# Altium footprint library heromap.PcbLib: 593 footprints (part 30 of 38)
Each footprint in its own frame and in the unit in brackets; x right, y up, seen from the top. Pads: shape width x height; smd on the part's side, far side on the other; paste and mask are expansions set on the pad; w line width, h text height; cw(c..) or ccw(c..) is an arc to the next point about the centre after c.
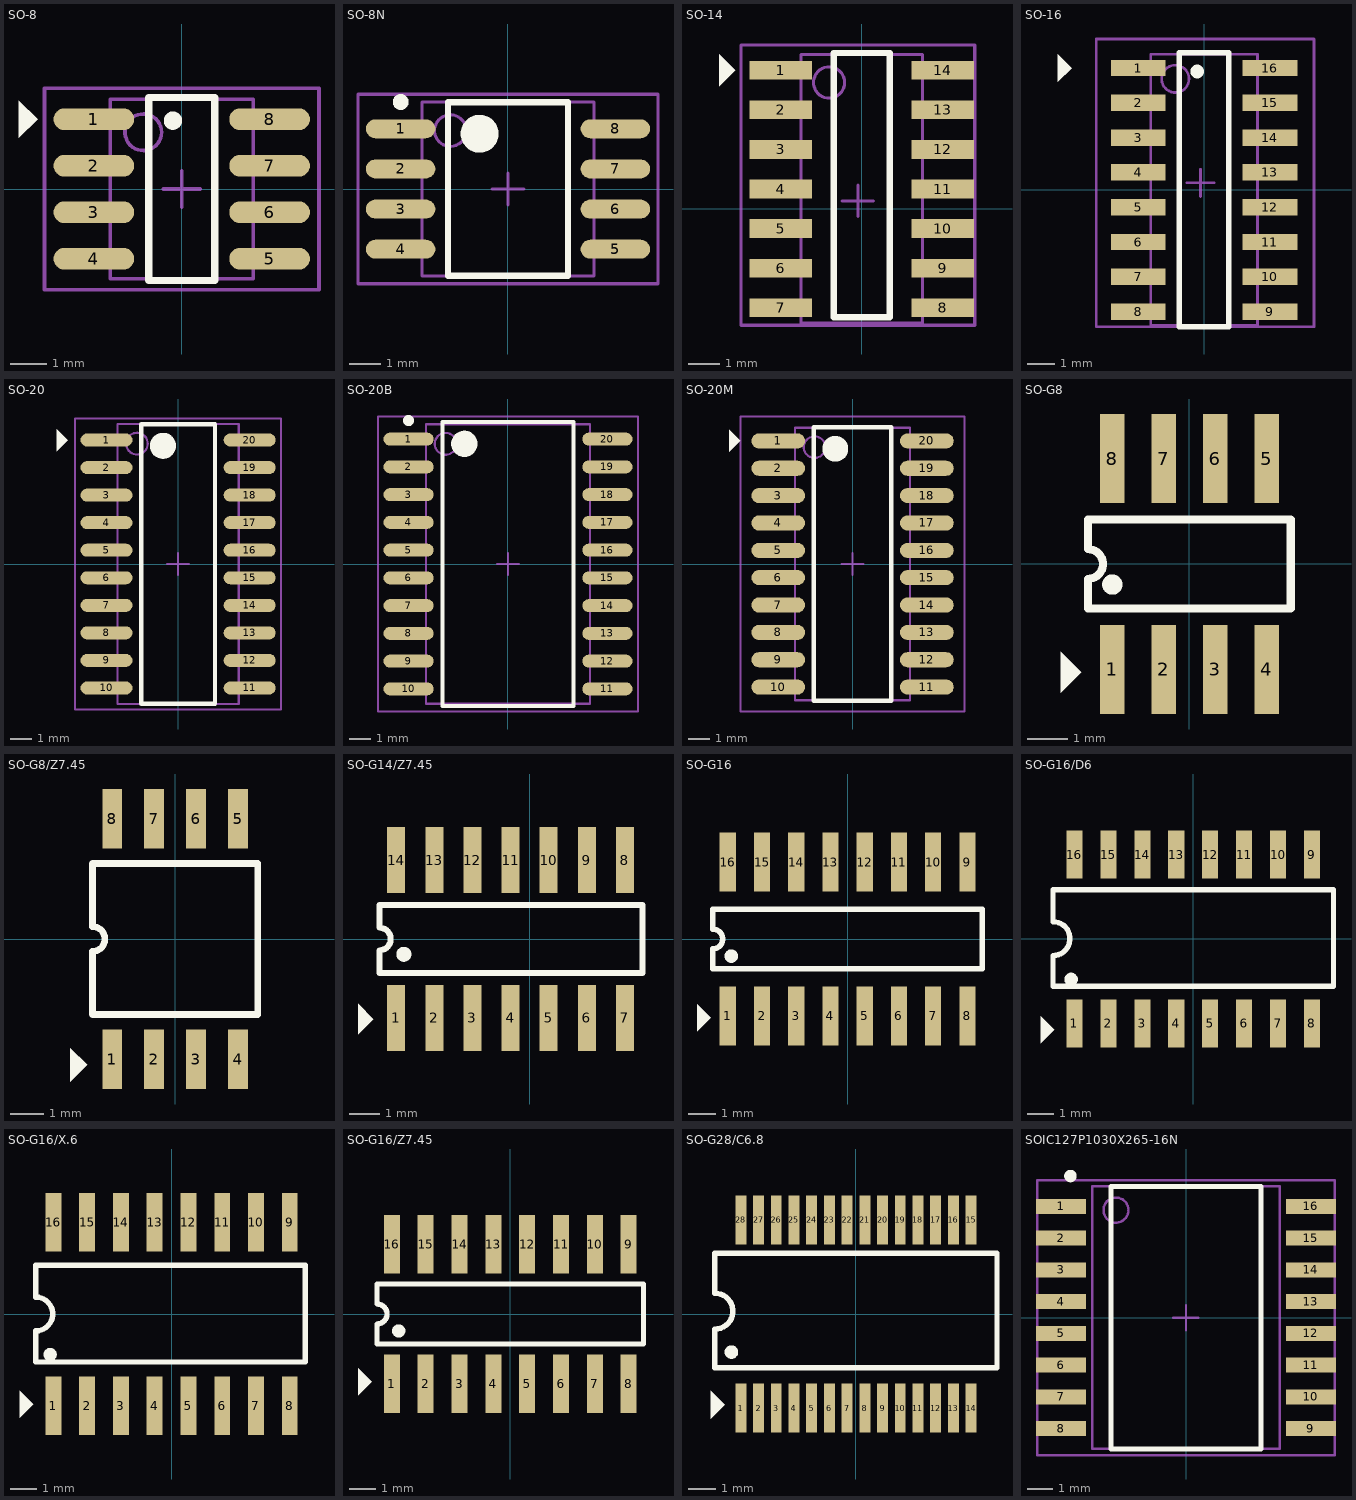
[diagram p29: the footprints below, top view; thin cyan lines are the x and y axes]

## SO-8 [mm] "8-Pin Small Outline Integrated Circuit 1.27 mm Pitch, IPC Medium Density"
height 1.75
pads (8):
  oval 2.2x0.6 smd: 1(-2.4,1.905) 2(-2.4,0.635) 3(-2.4,-0.635) 4(-2.4,-1.905) 5(2.4,-1.905) 6(2.4,-0.635) 7(2.4,0.635) 8(2.4,1.905)
Top Overlay:
  circle w0.25: c-0.241,1.866 r0.125
  region: -4.445,1.397 -3.937,1.905 -4.445,2.413
  lines w0.2: -0.9,-2.5 -0.9,2.5 0.9,2.5 0.9,-2.5 -0.9,-2.5
Mechanical 13:
  circle w0.1: c-1.05,1.55 r0.5
  lines w0.1: -1.95,-2.45 -1.95,2.45 1.95,2.45 1.95,-2.45 -1.95,-2.45
Mechanical 15:
  lines w0.1: -0.5,0 0.5,0 ; 0,-0.5 0,0.5 ; -3.75,-2.75 -3.75,2.75 3.75,2.75 3.75,-2.75 -3.75,-2.75
3D body: height 1.75, standoff 0, extent -1.95,-2.45 1.95,2.45

## SO-8N [mm] "SOP, 8-Leads, Body 5.3x5.3mm, Pitch 1.27mm, IPC Medium Density"
height 2.03
pads (8):
  oval 2.2x0.6 smd: 1(-3.4,1.905) 2(-3.4,0.635) 3(-3.4,-0.635) 4(-3.4,-1.905) 5(3.4,-1.905) 6(3.4,-0.635) 7(3.4,0.635) 8(3.4,1.905)
Top Overlay:
  circle w0.25: c-3.4,2.755 r0.125
  circle w0.6: c-0.9,1.75 r0.3
  lines w0.2: -1.9,-2.75 -1.9,2.75 1.9,2.75 1.9,-2.75 -1.9,-2.75
Mechanical 13:
  circle w0.1: c-1.825,1.85 r0.5
  lines w0.1: -2.725,-2.75 -2.725,2.75 2.725,2.75 2.725,-2.75 -2.725,-2.75
Mechanical 15:
  lines w0.1: -0.5,0 0.5,0 ; 0,-0.5 0,0.5 ; -4.75,-3 -4.75,3 4.75,3 4.75,-3 -4.75,-3
3D body: height 2.03, standoff 0, extent -2.725,-2.75 2.725,2.75

## SO-14 [mm] "SOIC, 14-Leads, Body 9.9x3.9mm, Pitch 1.27mm, IPC Medium Density"
height 1.75
pads (14):
  rect 2x0.6 smd: 1(-2.6,4.445) 2(-2.6,3.175) 3(-2.6,1.905) 4(-2.6,0.635) 5(-2.6,-0.635) 6(-2.6,-1.905) 7(-2.6,-3.175) 8(2.6,-3.175) 9(2.6,-1.905) 10(2.6,-0.635) 11(2.6,0.635) 12(2.6,1.905) 13(2.6,3.175) 14(2.6,4.445)
Top Overlay:
  region: -4.572,3.937 -4.064,4.445 -4.572,4.953
  lines w0.2: -0.9,-3.48 -0.9,5 0.9,5 0.9,-3.48 -0.9,-3.48
Mechanical 13:
  circle w0.1: c-1.05,4.05 r0.5
  lines w0.1: -1.95,-3.658 -1.95,4.95 1.95,4.95 1.95,-3.658 -1.95,-3.658
Mechanical 15:
  lines w0.1: -0.627,0.254 0.373,0.254 ; -0.127,-0.246 -0.127,0.754 ; -3.877,-3.734 -3.877,5.258 3.623,5.258 3.623,-3.734 -3.877,-3.734
3D body: height 1.75, standoff 0, extent -1.956,-3.658 1.95,4.95
3D body: height 0.1, standoff 0, extent 2.6,4.191 3.362,4.699
3D body: height 1.35, standoff 0, extent 2.473,4.191 2.6,4.699
3D body: height 1.35, standoff 1.25, extent 1.203,4.191 2.473,4.699
3D body: height 0.1, standoff 0, extent 2.6,2.921 3.362,3.429
3D body: height 1.35, standoff 0, extent 2.473,2.921 2.6,3.429
3D body: height 1.35, standoff 1.25, extent 1.203,2.921 2.473,3.429
3D body: height 0.1, standoff 0, extent 2.6,1.651 3.362,2.159
3D body: height 1.35, standoff 0, extent 2.473,1.651 2.6,2.159
3D body: height 1.35, standoff 1.25, extent 1.203,1.651 2.473,2.159
3D body: height 0.1, standoff 0, extent 2.6,0.381 3.362,0.889
3D body: height 1.35, standoff 0, extent 2.473,0.381 2.6,0.889
3D body: height 1.35, standoff 1.25, extent 1.203,0.381 2.473,0.889
3D body: height 0.1, standoff 0, extent 2.6,-0.889 3.362,-0.381
3D body: height 1.35, standoff 0, extent 2.473,-0.889 2.6,-0.381
3D body: height 1.35, standoff 1.25, extent 1.203,-0.889 2.473,-0.381
3D body: height 0.1, standoff 0, extent 2.6,-2.159 3.362,-1.651
3D body: height 1.35, standoff 0, extent 2.473,-2.159 2.6,-1.651
3D body: height 1.35, standoff 1.25, extent 1.203,-2.159 2.473,-1.651
3D body: height 0.1, standoff 0, extent 2.6,-3.429 3.362,-2.921
3D body: height 1.35, standoff 0, extent 2.473,-3.429 2.6,-2.921
3D body: height 1.35, standoff 1.25, extent 1.203,-3.429 2.473,-2.921
3D body: height 0.1, standoff 0, extent -3.362,-3.429 -2.6,-2.921
3D body: height 1.35, standoff 0, extent -2.6,-3.429 -2.473,-2.921
3D body: height 1.35, standoff 1.25, extent -2.473,-3.429 -1.203,-2.921
3D body: height 0.1, standoff 0, extent -3.362,-2.159 -2.6,-1.651
3D body: height 1.35, standoff 0, extent -2.6,-2.159 -2.473,-1.651
3D body: height 1.35, standoff 1.25, extent -2.473,-2.159 -1.203,-1.651
3D body: height 0.1, standoff 0, extent -3.362,-0.889 -2.6,-0.381
3D body: height 1.35, standoff 0, extent -2.6,-0.889 -2.473,-0.381
3D body: height 1.35, standoff 1.25, extent -2.473,-0.889 -1.203,-0.381
3D body: height 0.1, standoff 0, extent -3.362,0.381 -2.6,0.889
3D body: height 1.35, standoff 0, extent -2.6,0.381 -2.473,0.889
3D body: height 1.35, standoff 1.25, extent -2.473,0.381 -1.203,0.889
3D body: height 0.1, standoff 0, extent -3.362,1.651 -2.6,2.159
3D body: height 1.35, standoff 0, extent -2.6,1.651 -2.473,2.159
3D body: height 1.35, standoff 1.25, extent -2.473,1.651 -1.203,2.159
3D body: height 0.1, standoff 0, extent -3.362,2.921 -2.6,3.429
3D body: height 1.35, standoff 0, extent -2.6,2.921 -2.473,3.429
3D body: height 1.35, standoff 1.25, extent -2.473,2.921 -1.203,3.429
3D body: height 1.35, standoff 1.25, extent -2.489,4.191 -1.219,4.699
3D body: height 1.35, standoff 0, extent -2.616,4.191 -2.489,4.699
3D body: height 0.1, standoff 0, extent -3.378,4.191 -2.616,4.699

## SO-16 [mm] "SOIC, 16-Leads, Body 9.9x3.9mm, Pitch 1.27mm, IPC Medium Density"
height 1.75
pads (16):
  rect 2x0.6 smd: 1(-2.4,4.445) 2(-2.4,3.175) 3(-2.4,1.905) 4(-2.4,0.635) 5(-2.4,-0.635) 6(-2.4,-1.905) 7(-2.4,-3.175) 8(-2.4,-4.445) 9(2.4,-4.445) 10(2.4,-3.175) 11(2.4,-1.905) 12(2.4,-0.635) 13(2.4,0.635) 14(2.4,1.905) 15(2.4,3.175) 16(2.4,4.445)
Top Overlay:
  circle w0.25: c-0.252,4.318 r0.125
  region: -5.334,3.937 -4.826,4.445 -5.334,4.953
  lines w0.2: -0.9,-5 -0.9,5 0.9,5 0.9,-5 -0.9,-5
Mechanical 13:
  circle w0.1: c-1.05,4.05 r0.5
  lines w0.1: -1.95,-4.95 -1.95,4.95 1.95,4.95 1.95,-4.95 -1.95,-4.95
Mechanical 15:
  lines w0.1: -0.627,0.254 0.373,0.254 ; -0.127,-0.246 -0.127,0.754 ; -3.937,-4.996 -3.937,5.504 4.013,5.504 4.013,-4.996 -3.937,-4.996
3D body: height 1.75, standoff 0, extent -1.95,-4.95 1.95,4.95
3D body: height 0.9, standoff 0.7, extent 1.354,-4.691 2.393,-4.199
3D body: height 0.9, standoff 0, extent 2.393,-4.691 2.718,-4.199
3D body: height 0.2, standoff 0, extent 2.718,-4.691 3.414,-4.199
3D body: height 0.9, standoff 0.7, extent 1.379,-3.421 2.418,-2.929
3D body: height 0.9, standoff 0, extent 2.418,-3.421 2.743,-2.929
3D body: height 0.2, standoff 0, extent 2.743,-3.421 3.439,-2.929
3D body: height 0.9, standoff 0.7, extent 1.379,-2.151 2.418,-1.659
3D body: height 0.9, standoff 0, extent 2.418,-2.151 2.743,-1.659
3D body: height 0.2, standoff 0, extent 2.743,-2.151 3.439,-1.659
3D body: height 0.9, standoff 0.7, extent 1.481,-0.881 2.52,-0.389
3D body: height 0.9, standoff 0, extent 2.52,-0.881 2.845,-0.389
3D body: height 0.2, standoff 0, extent 2.845,-0.881 3.541,-0.389
3D body: height 0.9, standoff 0.7, extent 1.379,0.389 2.418,0.881
3D body: height 0.9, standoff 0, extent 2.418,0.389 2.743,0.881
3D body: height 0.2, standoff 0, extent 2.743,0.389 3.439,0.881
3D body: height 0.9, standoff 0.7, extent 1.405,1.659 2.443,2.151
3D body: height 0.9, standoff 0, extent 2.443,1.659 2.769,2.151
3D body: height 0.2, standoff 0, extent 2.769,1.659 3.465,2.151
3D body: height 0.9, standoff 0.7, extent 1.328,2.903 2.367,3.396
3D body: height 0.9, standoff 0, extent 2.367,2.903 2.692,3.396
3D body: height 0.2, standoff 0, extent 2.692,2.903 3.388,3.396
3D body: height 0.9, standoff 0.7, extent 1.354,4.199 2.393,4.691
3D body: height 0.9, standoff 0, extent 2.393,4.199 2.718,4.691
3D body: height 0.2, standoff 0, extent 2.718,4.199 3.414,4.691
3D body: height 0.2, standoff 0, extent -3.389,-4.686 -2.693,-4.194
3D body: height 0.9, standoff 0, extent -2.693,-4.686 -2.368,-4.194
3D body: height 0.9, standoff 0.7, extent -2.368,-4.686 -1.329,-4.194
3D body: height 0.2, standoff 0, extent -3.364,-3.391 -2.668,-2.898
3D body: height 0.9, standoff 0, extent -2.668,-3.391 -2.343,-2.898
3D body: height 0.9, standoff 0.7, extent -2.343,-3.391 -1.304,-2.898
3D body: height 0.2, standoff 0, extent -3.44,-2.146 -2.744,-1.654
3D body: height 0.9, standoff 0, extent -2.744,-2.146 -2.419,-1.654
3D body: height 0.9, standoff 0.7, extent -2.419,-2.146 -1.38,-1.654
3D body: height 0.2, standoff 0, extent -3.415,-0.876 -2.719,-0.384
3D body: height 0.9, standoff 0, extent -2.719,-0.876 -2.394,-0.384
3D body: height 0.9, standoff 0.7, extent -2.394,-0.876 -1.355,-0.384
3D body: height 0.2, standoff 0, extent -3.516,0.394 -2.82,0.886
3D body: height 0.9, standoff 0, extent -2.82,0.394 -2.495,0.886
3D body: height 0.9, standoff 0.7, extent -2.495,0.394 -1.456,0.886
3D body: height 0.2, standoff 0, extent -3.415,1.664 -2.719,2.156
3D body: height 0.9, standoff 0, extent -2.719,1.664 -2.394,2.156
3D body: height 0.9, standoff 0.7, extent -2.394,1.664 -1.355,2.156
3D body: height 0.2, standoff 0, extent -3.415,2.934 -2.719,3.426
3D body: height 0.9, standoff 0, extent -2.719,2.934 -2.394,3.426
3D body: height 0.9, standoff 0.7, extent -2.394,2.934 -1.355,3.426
3D body: height 0.2, standoff 0, extent -3.389,4.204 -2.693,4.696
3D body: height 0.9, standoff 0, extent -2.693,4.204 -2.368,4.696
3D body: height 0.9, standoff 0.7, extent -2.368,4.204 -1.329,4.696

## SO-20 [mm] "20-Pin Small Outline Package 1.27 mm Pitch"
height 2
pads (20):
  oval 2.4x0.6 smd: 1(-3.3,5.715) 2(-3.3,4.445) 3(-3.3,3.175) 4(-3.3,1.905) 5(-3.3,0.635) 6(-3.3,-0.635) 7(-3.3,-1.905) 8(-3.3,-3.175) 9(-3.3,-4.445) 10(-3.3,-5.715) 11(3.3,-5.715) 12(3.3,-4.445) 13(3.3,-3.175) 14(3.3,-1.905) 15(3.3,-0.635) 16(3.3,0.635) 17(3.3,1.905) 18(3.3,3.175) 19(3.3,4.445) 20(3.3,5.715)
Top Overlay:
  circle w0.6: c-0.7,5.45 r0.3
  region: -5.588,5.207 -5.08,5.715 -5.588,6.223
  lines w0.2: -1.7,-6.45 1.7,-6.45 1.7,6.45 -1.7,6.45 -1.7,-6.45
Mechanical 13:
  circle w0.1: c-1.9,5.55 r0.5
  lines w0.1: -2.8,-6.45 2.8,-6.45 2.8,6.45 -2.8,6.45 -2.8,-6.45
Mechanical 15:
  lines w0.1: -0.5,0 0.5,0 ; 0,-0.5 0,0.5 ; -4.75,-6.7 4.75,-6.7 4.75,6.7 -4.75,6.7 -4.75,-6.7
3D body: height 2, standoff 0, extent -2.8,-6.45 2.8,6.45

## SO-20B [mm] "SOIC, 20-Leads, Body 12.8x7.5mm, Pitch 1.27mm, IPC Medium Density"
height 2.6
pads (20):
  oval 2.3x0.6 smd: 1(-4.55,5.715) 2(-4.55,4.445) 3(-4.55,3.175) 4(-4.55,1.905) 5(-4.55,0.635) 6(-4.55,-0.635) 7(-4.55,-1.905) 8(-4.55,-3.175) 9(-4.55,-4.445) 10(-4.55,-5.715) 11(4.55,-5.715) 12(4.55,-4.445) 13(4.55,-3.175) 14(4.55,-1.905) 15(4.55,-0.635) 16(4.55,0.635) 17(4.55,1.905) 18(4.55,3.175) 19(4.55,4.445) 20(4.55,5.715)
Top Overlay:
  circle w0.25: c-4.55,6.565 r0.125
  circle w0.6: c-2,5.5 r0.3
  lines w0.2: -3,-6.5 -3,6.5 3,6.5 3,-6.5 -3,-6.5
Mechanical 13:
  circle w0.1: c-2.85,5.5 r0.5
  lines w0.1: -3.75,-6.4 -3.75,6.4 3.75,6.4 3.75,-6.4 -3.75,-6.4
Mechanical 15:
  lines w0.1: -0.5,0 0.5,0 ; 0,-0.5 0,0.5 ; -5.95,-6.75 -5.95,6.75 5.95,6.75 5.95,-6.75 -5.95,-6.75
3D body: height 2.6, standoff 0, extent -3.75,-6.4 3.75,6.4

## SO-20M [mm] "SOP, 20-Leads, Body 12.6x5.3mm, Pitch 1.27mm, IPC Low Density"
height 1.96
pads (20):
  oval 2.5x0.7 smd: 1(-3.45,5.715) 2(-3.45,4.445) 3(-3.45,3.175) 4(-3.45,1.905) 5(-3.45,0.635) 6(-3.45,-0.635) 7(-3.45,-1.905) 8(-3.45,-3.175) 9(-3.45,-4.445) 10(-3.45,-5.715) 11(3.45,-5.715) 12(3.45,-4.445) 13(3.45,-3.175) 14(3.45,-1.905) 15(3.45,-0.635) 16(3.45,0.635) 17(3.45,1.905) 18(3.45,3.175) 19(3.45,4.445) 20(3.45,5.715)
Top Overlay:
  circle w0.6: c-0.8,5.35 r0.3
  region: -5.715,5.207 -5.207,5.715 -5.715,6.223
  lines w0.2: -1.8,-6.35 -1.8,6.35 1.8,6.35 1.8,-6.35 -1.8,-6.35
Mechanical 13:
  circle w0.1: c-1.765,5.425 r0.5
  lines w0.1: -2.665,-6.325 -2.665,6.325 2.665,6.325 2.665,-6.325 -2.665,-6.325
Mechanical 15:
  lines w0.1: -0.5,0 0.5,0 ; 0,-0.5 0,0.5 ; -5.2,-6.85 -5.2,6.85 5.2,6.85 5.2,-6.85 -5.2,-6.85
3D body: height 1.96, standoff 0, extent -2.665,-6.325 2.665,6.325

## SO-G8 [mm] "Small Outline; 8 Leads; Body Width 3.9 mm; Pitch 1.27 mm"
height 1.75
pads (8):
  rect 0.6x2.2 smd: 1(-1.905,-2.6) 2(-0.635,-2.6) 3(0.635,-2.6) 4(1.905,-2.6) 5(1.905,2.6) 6(0.635,2.6) 7(-0.635,2.6) 8(-1.905,2.6)
Top Overlay:
  circle w0.25: c-1.903,-0.508 r0.125
  region: -3.175,-3.175 -2.667,-2.667 -3.175,-2.159
  lines w0.2: -2.5,-1.1 -2.5,-0.367 ccw(c-2.5,0) -2.5,0.367 -2.5,1.1 2.5,1.1 2.5,-1.1 -2.5,-1.1

## SO-G8/Z7.45 [mm] "Small Outline; 8 Leads; Body Width 3.9 mm; Pitch 1.27 mm"
height 1.75
pads (8):
  rect 0.6x1.8 smd: 1(-1.905,-3.641) 2(-0.635,-3.641) 3(0.635,-3.641) 4(1.905,-3.641) 5(1.905,3.641) 6(0.635,3.641) 7(-0.635,3.641) 8(-1.905,3.641)
Top Overlay:
  region: -3.175,-4.318 -2.667,-3.81 -3.175,-3.302
  lines w0.2: -2.5,-2.286 -2.5,-0.375 ccw(c-2.5,0) -2.5,0.375 -2.5,2.286 2.5,2.286 2.5,-2.286 -2.5,-2.286
3D body: height 1.5, standoff 0.1, extent -2.794,-2.54 2.794,2.54
3D body: height 0.25, standoff 0, extent 1.651,3.051 2.159,3.737
3D body: height 0.9, standoff 0.65, extent 1.651,2.537 2.159,3.051
3D body: height 0.9, standoff 0, extent 1.651,2.95 2.159,3.102
3D body: height 0.9, standoff 0, extent 0.381,2.95 0.889,3.102
3D body: height 0.9, standoff 0.65, extent 0.381,2.537 0.889,3.051
3D body: height 0.25, standoff 0, extent 0.381,3.051 0.889,3.737
3D body: height 0.25, standoff 0, extent -2.159,3.051 -1.651,3.737
3D body: height 0.9, standoff 0.65, extent -2.159,2.537 -1.651,3.051
3D body: height 0.9, standoff 0, extent -2.159,2.95 -1.651,3.102
3D body: height 0.9, standoff 0, extent -0.889,2.95 -0.381,3.102
3D body: height 0.9, standoff 0.65, extent -0.889,2.537 -0.381,3.051
3D body: height 0.25, standoff 0, extent -0.889,3.051 -0.381,3.737
3D body: height 0.25, standoff 0, extent -2.159,-3.74 -1.651,-3.055
3D body: height 0.9, standoff 0.65, extent -2.159,-3.055 -1.651,-2.54
3D body: height 0.9, standoff 0, extent -2.159,-3.105 -1.651,-2.953
3D body: height 0.9, standoff 0, extent -0.889,-3.105 -0.381,-2.953
3D body: height 0.9, standoff 0.65, extent -0.889,-3.055 -0.381,-2.54
3D body: height 0.25, standoff 0, extent -0.889,-3.74 -0.381,-3.055
3D body: height 0.25, standoff 0, extent 1.651,-3.74 2.159,-3.055
3D body: height 0.9, standoff 0.65, extent 1.651,-3.055 2.159,-2.54
3D body: height 0.9, standoff 0, extent 1.651,-3.105 2.159,-2.953
3D body: height 0.9, standoff 0, extent 0.381,-3.105 0.889,-2.953
3D body: height 0.9, standoff 0.65, extent 0.381,-3.055 0.889,-2.54
3D body: height 0.25, standoff 0, extent 0.381,-3.74 0.889,-3.055

## SO-G14/Z7.45 [mm] "Small Outline; 14 Leads; Body Width 3.9 mm; Pitch 1.27 mm"
height 1.75
pads (14):
  rect 0.6x2.2 smd: 1(-4.445,-2.625) 2(-3.175,-2.625) 3(-1.905,-2.625) 4(-0.635,-2.625) 5(0.635,-2.625) 6(1.905,-2.625) 7(3.175,-2.625) 8(3.175,2.625) 9(1.905,2.625) 10(0.635,2.625) 11(-0.635,2.625) 12(-1.905,2.625) 13(-3.175,2.625) 14(-4.445,2.625)
Top Overlay:
  circle w0.25: c-4.189,-0.508 r0.125
  region: -5.715,-3.175 -5.207,-2.667 -5.715,-2.159
  lines w0.2: -5,-1.125 3.759,-1.125 3.759,1.125 -5,1.125 -5,0.375 cw(c-5,0) -5,-0.375 -5,-1.125

## SO-G16 [mm] "Small Outline; 16 Leads; Body Width 3.9 mm; Pitch 1.27 mm"
height 1.75
pads (16):
  rect 0.6x2.2 smd: 1(-4.445,-2.854) 2(-3.175,-2.854) 3(-1.905,-2.854) 4(-0.635,-2.854) 5(0.635,-2.854) 6(1.905,-2.854) 7(3.175,-2.854) 8(4.445,-2.854) 9(4.445,2.854) 10(3.175,2.854) 11(1.905,2.854) 12(0.635,2.854) 13(-0.635,2.854) 14(-1.905,2.854) 15(-3.175,2.854) 16(-4.445,2.854)
Top Overlay:
  circle w0.25: c-4.316,-0.635 r0.125
  region: -5.588,-3.429 -5.08,-2.921 -5.588,-2.413
  lines w0.2: -5,-1.1 -5,-0.367 ccw(c-5,0) -5,0.367 -5,1.1 5,1.1 5,-1.1 -5,-1.1

## SO-G16/D6 [mm] "Small Outline; 16 Leads; Body Width 5.3 mm; Pitch 1.27 mm"
height 2
pads (16):
  rect 0.6x1.8 smd: 1(-4.445,-3.168) 2(-3.175,-3.168) 3(-1.905,-3.168) 4(-0.635,-3.168) 5(0.635,-3.168) 6(1.905,-3.168) 7(3.175,-3.168) 8(4.445,-3.168) 9(4.445,3.143) 10(3.175,3.143) 11(1.905,3.143) 12(0.635,3.143) 13(-0.635,3.143) 14(-1.905,3.143) 15(-3.175,3.143) 16(-4.445,3.143)
Top Overlay:
  circle w0.25: c-4.57,-1.524 r0.125
  region: -5.715,-3.912 -5.207,-3.404 -5.715,-2.896
  lines w0.2: -5.25,-1.778 5.25,-1.778 5.25,1.829 -5.25,1.829 -5.25,0.635 cw(c-5.25,0) -5.25,-0.635 -5.25,-1.778

## SO-G16/X.6 [mm] "Small Outline; 16 Leads; Body Width 5.3 mm; Pitch 1.27 mm"
height 2
pads (16):
  rect 0.6x2.2 smd: 1(-4.445,-3.448) 2(-3.175,-3.448) 3(-1.905,-3.448) 4(-0.635,-3.448) 5(0.635,-3.448) 6(1.905,-3.448) 7(3.175,-3.448) 8(4.445,-3.448) 9(4.445,3.448) 10(3.175,3.448) 11(1.905,3.448) 12(0.635,3.448) 13(-0.635,3.448) 14(-1.905,3.448) 15(-3.175,3.448) 16(-4.445,3.448)
Top Overlay:
  circle w0.25: c-4.57,-1.524 r0.125
  region: -5.715,-3.912 -5.207,-3.404 -5.715,-2.896
  lines w0.2: -5.105,0.635 cw(c-5.105,0) -5.105,-0.635 -5.105,-1.803 5.029,-1.803 5.029,1.829 -5.105,1.829 -5.105,0.686

## SO-G16/Z7.45 [mm] "Small Outline; 16 Leads; Body Width 3.9 mm; Pitch 1.27 mm"
height 1.75
pads (16):
  rect 0.6x2.2 smd: 1(-4.445,-2.625) 2(-3.175,-2.625) 3(-1.905,-2.625) 4(-0.635,-2.625) 5(0.635,-2.625) 6(1.905,-2.625) 7(3.175,-2.625) 8(4.445,-2.625) 9(4.445,2.625) 10(3.175,2.625) 11(1.905,2.625) 12(0.635,2.625) 13(-0.635,2.625) 14(-1.905,2.625) 15(-3.175,2.625) 16(-4.445,2.625)
Top Overlay:
  circle w0.25: c-4.189,-0.635 r0.125
  region: -5.715,-3.048 -5.207,-2.54 -5.715,-2.032
  lines w0.2: -5,-1.125 -5,-0.375 ccw(c-5,0) -5,0.375 -5,1.125 5,1.125 5,-1.125 -5,-1.125

## SO-G28/C6.8 [mm] "SSOP, Plastic; 28 Leads; Body Width 5.3 mm; Pitch 0.65 mm"
height 1.99
pads (28):
  rect 0.4x1.8 smd: 1(-4.225,-3.451) 2(-3.575,-3.451) 3(-2.925,-3.451) 4(-2.275,-3.451) 5(-1.625,-3.451) 6(-0.975,-3.451) 7(-0.325,-3.451) 8(0.325,-3.451) 9(0.975,-3.451) 10(1.625,-3.451) 11(2.275,-3.451) 12(2.925,-3.451) 13(3.575,-3.451) 14(4.225,-3.451) 15(4.225,3.451) 16(3.575,3.451) 17(2.925,3.451) 18(2.275,3.451) 19(1.625,3.451) 20(0.975,3.451) 21(0.325,3.451) 22(-0.325,3.451) 23(-0.975,3.451) 24(-1.625,3.451) 25(-2.275,3.451) 26(-2.925,3.451) 27(-3.575,3.451) 28(-4.225,3.451)
Top Overlay:
  circle w0.25: c-4.57,-1.397 r0.125
  region: -5.327,-3.835 -4.819,-3.327 -5.327,-2.819
  lines w0.2: -5.175,-1.975 5.175,-1.975 5.175,2.229 -5.175,2.229 -5.175,0.762 cw(c-5.175,0.104) -5.175,-0.555 -5.175,-1.975
3D body: height 1.14, standoff 1.02, extent -4.804,-1.748 -4.296,-1.24
3D body: height 0.25, standoff 0, extent -3.759,2.286 -3.378,3.683
3D body: height 0.25, standoff 0, extent -4.42,2.286 -4.039,3.683
3D body: height 0.25, standoff 0, extent -3.124,2.261 -2.743,3.658
3D body: height 0.25, standoff 0, extent -2.464,2.261 -2.083,3.658
3D body: height 0.25, standoff 0, extent -1.829,2.261 -1.448,3.658
3D body: height 0.25, standoff 0, extent -1.168,2.261 -0.787,3.658
3D body: height 0.25, standoff 0, extent -0.508,2.261 -0.127,3.658
3D body: height 0.25, standoff 0, extent 0.152,2.261 0.533,3.658
3D body: height 0.25, standoff 0, extent 0.762,2.261 1.143,3.658
3D body: height 0.25, standoff 0, extent 1.422,2.261 1.803,3.658
3D body: height 0.25, standoff 0, extent 2.083,2.261 2.464,3.658
3D body: height 0.25, standoff 0, extent 2.743,2.261 3.124,3.658
3D body: height 0.25, standoff 0, extent 3.378,2.261 3.759,3.658
3D body: height 0.25, standoff 0, extent 4.039,2.261 4.42,3.658
3D body: height 0.25, standoff 0, extent 4.039,-3.708 4.42,-2.311
3D body: height 0.25, standoff 0, extent 3.378,-3.708 3.759,-2.311
3D body: height 0.25, standoff 0, extent 2.743,-3.708 3.124,-2.311
3D body: height 0.25, standoff 0, extent 2.083,-3.708 2.464,-2.311
3D body: height 0.25, standoff 0, extent 1.422,-3.708 1.803,-2.311
3D body: height 0.25, standoff 0, extent 0.762,-3.708 1.143,-2.311
3D body: height 0.25, standoff 0, extent 0.152,-3.708 0.533,-2.311
3D body: height 0.25, standoff 0, extent -0.508,-3.708 -0.127,-2.311
3D body: height 0.25, standoff 0, extent -1.168,-3.708 -0.787,-2.311
3D body: height 0.25, standoff 0, extent -1.829,-3.708 -1.448,-2.311
3D body: height 0.25, standoff 0, extent -2.464,-3.708 -2.083,-2.311
3D body: height 0.25, standoff 0, extent -3.124,-3.708 -2.743,-2.311
3D body: height 1.02, standoff 0.23, extent -5.175,-2.286 5.175,2.286
3D body: height 0.25, standoff 0, extent -4.42,-3.683 -4.039,-2.286
3D body: height 0.25, standoff 0, extent -3.759,-3.683 -3.378,-2.286

## SOIC127P1030X265-16N [mm] "SOIC, 16-Leads, Body 10,5x7,5mm (max), Pitch 1,27mm, IPC Medium Density"
height 2.65
pads (16):
  rect 2x0.6 smd: 1(-5,4.445) 2(-5,3.175) 3(-5,1.905) 4(-5,0.635) 5(-5,-0.635) 6(-5,-1.905) 7(-5,-3.175) 8(-5,-4.445) 9(5,-4.445) 10(5,-3.175) 11(5,-1.905) 12(5,-0.635) 13(5,0.635) 14(5,1.905) 15(5,3.175) 16(5,4.445)
Top Overlay:
  circle w0.25: c-4.621,5.664 r0.125
  lines w0.2: -3,-5.25 3,-5.25 3,5.25 -3,5.25 -3,-5.25
Mechanical 13:
  circle w0.1: c-2.8,4.3 r0.5
  lines w0.1: -3.75,-5.25 3.75,-5.25 3.75,5.25 -3.75,5.25 -3.75,-5.25
Mechanical 15:
  lines w0.1: -0.5,0 0.5,0 ; 0,-0.5 0,0.5 ; -5.95,-5.5 5.95,-5.5 5.95,5.5 -5.95,5.5 -5.95,-5.5
3D body: height 2.65, standoff 0.1, extent -3.75,-5.25 3.75,5.25
3D body: height 1.35, standoff 1.25, extent -4.492,4.191 -3.222,4.699
3D body: height 1.35, standoff 0, extent -4.619,4.191 -4.492,4.699
3D body: height 0.1, standoff 0, extent -5.381,4.191 -4.619,4.699
3D body: height 1.35, standoff 1.25, extent -4.492,2.921 -3.222,3.429
3D body: height 1.35, standoff 0, extent -4.619,2.921 -4.492,3.429
3D body: height 0.1, standoff 0, extent -5.381,2.921 -4.619,3.429
3D body: height 1.35, standoff 1.25, extent -4.492,1.651 -3.222,2.159
3D body: height 1.35, standoff 0, extent -4.619,1.651 -4.492,2.159
3D body: height 0.1, standoff 0, extent -5.381,1.651 -4.619,2.159
3D body: height 1.35, standoff 1.25, extent -4.492,0.381 -3.222,0.889
3D body: height 1.35, standoff 0, extent -4.619,0.381 -4.492,0.889
3D body: height 0.1, standoff 0, extent -5.381,0.381 -4.619,0.889
3D body: height 1.35, standoff 1.25, extent -4.492,-0.889 -3.222,-0.381
3D body: height 1.35, standoff 0, extent -4.619,-0.889 -4.492,-0.381
3D body: height 0.1, standoff 0, extent -5.381,-0.889 -4.619,-0.381
3D body: height 1.35, standoff 1.25, extent -4.492,-2.159 -3.222,-1.651
3D body: height 1.35, standoff 0, extent -4.619,-2.159 -4.492,-1.651
3D body: height 0.1, standoff 0, extent -5.381,-2.159 -4.619,-1.651
3D body: height 1.35, standoff 1.25, extent -4.492,-3.429 -3.222,-2.921
3D body: height 1.35, standoff 0, extent -4.619,-3.429 -4.492,-2.921
3D body: height 0.1, standoff 0, extent -5.381,-3.429 -4.619,-2.921
3D body: height 1.35, standoff 1.25, extent -4.492,-4.699 -3.222,-4.191
3D body: height 1.35, standoff 0, extent -4.619,-4.699 -4.492,-4.191
3D body: height 0.1, standoff 0, extent -5.381,-4.699 -4.619,-4.191
3D body: height 1.35, standoff 1.25, extent 3.222,4.191 4.492,4.699
3D body: height 1.35, standoff 0, extent 4.492,4.191 4.619,4.699
3D body: height 0.1, standoff 0, extent 4.619,4.191 5.381,4.699
3D body: height 1.35, standoff 1.25, extent 3.222,2.921 4.492,3.429
3D body: height 1.35, standoff 0, extent 4.492,2.921 4.619,3.429
3D body: height 0.1, standoff 0, extent 4.619,2.921 5.381,3.429
3D body: height 1.35, standoff 1.25, extent 3.222,1.651 4.492,2.159
3D body: height 1.35, standoff 0, extent 4.492,1.651 4.619,2.159
3D body: height 0.1, standoff 0, extent 4.619,1.651 5.381,2.159
3D body: height 1.35, standoff 1.25, extent 3.222,0.381 4.492,0.889
3D body: height 1.35, standoff 0, extent 4.492,0.381 4.619,0.889
3D body: height 0.1, standoff 0, extent 4.619,0.381 5.381,0.889
3D body: height 1.35, standoff 1.25, extent 3.222,-0.889 4.492,-0.381
3D body: height 1.35, standoff 0, extent 4.492,-0.889 4.619,-0.381
3D body: height 0.1, standoff 0, extent 4.619,-0.889 5.381,-0.381
3D body: height 1.35, standoff 1.25, extent 3.222,-2.159 4.492,-1.651
3D body: height 1.35, standoff 0, extent 4.492,-2.159 4.619,-1.651
3D body: height 0.1, standoff 0, extent 4.619,-2.159 5.381,-1.651
3D body: height 1.35, standoff 1.25, extent 3.222,-3.429 4.492,-2.921
3D body: height 1.35, standoff 0, extent 4.492,-3.429 4.619,-2.921
3D body: height 0.1, standoff 0, extent 4.619,-3.429 5.381,-2.921
3D body: height 0.1, standoff 0, extent 4.619,-4.699 5.381,-4.191
3D body: height 1.35, standoff 0, extent 4.492,-4.699 4.619,-4.191
3D body: height 1.35, standoff 1.25, extent 3.222,-4.699 4.492,-4.191